# Altium footprint library ICs And Semiconductors SMD.PcbLib: 602 footprints (part 4 of 38)
Each footprint in its own frame and in the unit in brackets; x right, y up, seen from the top. Pads: shape width x height; smd on the part's side, far side on the other; paste and mask are expansions set on the pad; w line width, h text height; cw(c..) or ccw(c..) is an arc to the next point about the centre after c.
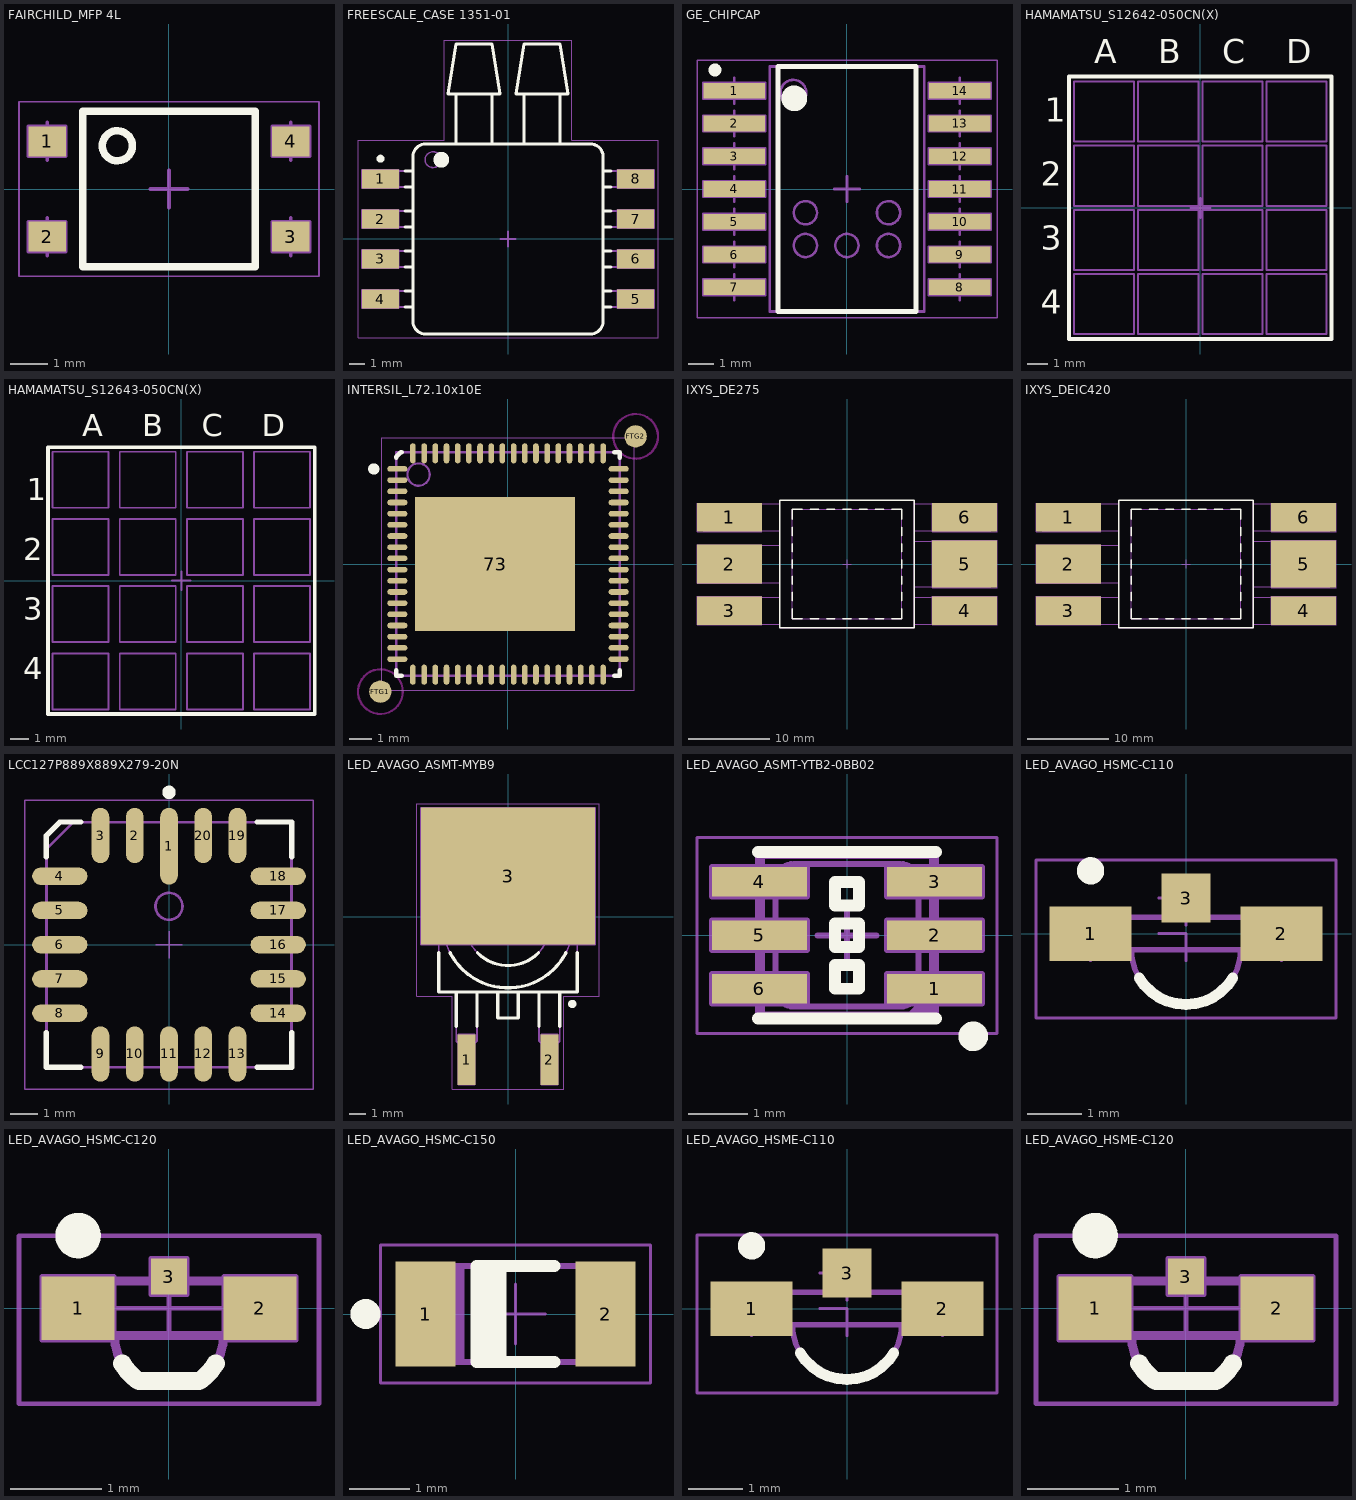
[diagram p3: the footprints below, top view; thin cyan lines are the x and y axes]

## FAIRCHILD_MFP 4L [mm] "4-Leads Surface Mount SOIC Package, Body 5.3x4.4mm, Pitch 2.54mm"
height 2.4
pads (4):
  rect 1x0.8 smd: 1(-3.25,1.27) 2(-3.25,-1.27) 3(3.25,-1.27) 4(3.25,1.27)
Top Overlay:
  circle w0.2: c-1.377,1.152 r0.4
  lines w0.2: -2.3,-2.075 2.3,-2.075 2.3,2.075 -2.3,2.075 -2.3,-2.075
Mechanical 8:
  lines w0.1: -3.75,-1.27 -3.25,-1.27 ; -3.75,1.27 -3.25,1.27 ; -3.25,-1.77 -3.25,-1.27 ; -3.25,-0.77 -3.25,-1.27 ; -3.25,0.77 -3.25,1.27 ; -3.25,1.77 -3.25,1.27 ; -2.75,-1.27 -3.25,-1.27 ; -2.75,1.27 -3.25,1.27 ; -0.5,0 0,0 ; 0,-0.5 0,0 ; 0,0.5 0,0 ; 0.5,0 0,0 ; 2.75,-1.27 3.25,-1.27 ; 2.75,1.27 3.25,1.27 ; 3.25,-1.77 3.25,-1.27 ; 3.25,-0.77 3.25,-1.27 ; 3.25,0.77 3.25,1.27 ; 3.25,1.77 3.25,1.27 ; 3.75,-1.27 3.25,-1.27 ; 3.75,1.27 3.25,1.27 ; -3.75,-1.67 -3.75,-0.87 -2.75,-0.87 ; -3.75,-1.67 -2.75,-1.67 -2.75,-0.87 ; -3.75,-1.67 -2.75,-0.87 ; -3.75,0.87 -3.75,1.67 -2.75,1.67 ; -3.75,0.87 -2.75,0.87 -2.75,1.67 ; -3.75,0.87 -2.75,1.67 ; 2.75,-1.67 2.75,-0.87 3.75,-0.87 3.75,-1.67 2.75,-1.67 ; 2.75,0.87 2.75,1.67 3.75,1.67 3.75,0.87 2.75,0.87
Mechanical 14:
  circle w0.1: c-1.377,1.152 r0.4
  lines w0.1: -2.3,-2.075 2.3,-2.075 2.3,2.075 -2.3,2.075 -2.3,-2.075
Mechanical 15:
  lines w0.05: -4,-2.325 -4,2.325 4,2.325 4,-2.325 -4,-2.325
3D body "FAIRCHILD_MFP 4L.stp": height 2.4, standoff 0, extent -3.514,-2.075 3.514,2.075

## FREESCALE_CASE 1351-01 [mm] "SOIC, 2.54mm Pitch; 8 Pin, 12.065mm W X 12.065mm L X 9.906mm H Body FREESCALE Case 1351-01"
height 9.906
pads (8):
  rect 2.35x1.2 smd: 1(-8.1,3.81) 2(-8.1,1.27) 3(-8.1,-1.27) 4(-8.1,-3.81) 5(8.1,-3.81) 6(8.1,-1.27) 7(8.1,1.27) 8(8.1,3.81)
Top Overlay:
  circle w0.5: c-4.235,5.035 r0.25
  circle w0.25: c-8.1,5.1 r0.125
  lines w0.2: -6.525,-4.318 -6.035,-4.318 ; -6.525,-3.302 -6.035,-3.302 ; -6.525,-1.778 -6.035,-1.778 ; -6.525,-0.762 -6.035,-0.762 ; -6.525,0.762 -6.035,0.762 ; -6.525,1.778 -6.035,1.778 ; -6.525,3.302 -6.035,3.302 ; -6.525,4.318 -6.035,4.318 ; -3.309,6.035 -3.309,9.21 ; -1.009,6.035 -1.009,9.21 ; 1.009,6.035 1.009,9.21 ; 3.309,6.035 3.309,9.21 ; 6.035,-4.318 6.525,-4.318 ; 6.035,-3.302 6.525,-3.302 ; 6.035,-1.778 6.525,-1.778 ; 6.035,-0.762 6.525,-0.762 ; 6.035,0.762 6.525,0.762 ; 6.035,1.778 6.525,1.778 ; 6.035,3.302 6.525,3.302 ; 6.035,4.318 6.525,4.318 ; -6.035,-5.235 ccw(c-5.235,-5.235) -5.235,-6.035 5.235,-6.035 ccw(c5.235,-5.235) 6.035,-5.235 6.035,5.235 ccw(c5.235,5.235) 5.235,6.035 -5.235,6.035 ccw(c-5.235,5.235) -6.035,5.235 -6.035,-5.235 ; -3.81,9.21 -3.309,12.385 -1.009,12.385 -0.508,9.21 -3.81,9.21 ; 0.508,9.21 1.009,12.385 3.309,12.385 3.81,9.21 0.508,9.21
Mechanical 8:
  lines w0.1: -8.6,-3.81 -8.1,-3.81 ; -8.6,-1.27 -8.1,-1.27 ; -8.6,1.27 -8.1,1.27 ; -8.6,3.81 -8.1,3.81 ; -8.1,-4.31 -8.1,-3.81 ; -8.1,-3.31 -8.1,-3.81 ; -8.1,-1.77 -8.1,-1.27 ; -8.1,-0.77 -8.1,-1.27 ; -8.1,0.77 -8.1,1.27 ; -8.1,1.77 -8.1,1.27 ; -8.1,3.31 -8.1,3.81 ; -8.1,4.31 -8.1,3.81 ; -7.6,-3.81 -8.1,-3.81 ; -7.6,-1.27 -8.1,-1.27 ; -7.6,1.27 -8.1,1.27 ; -7.6,3.81 -8.1,3.81 ; -0.5,0 0,0 ; 0,-0.5 0,0 ; 0,0.5 0,0 ; 0.5,0 0,0 ; 7.6,-3.81 8.1,-3.81 ; 7.6,-1.27 8.1,-1.27 ; 7.6,1.27 8.1,1.27 ; 7.6,3.81 8.1,3.81 ; 8.1,-4.31 8.1,-3.81 ; 8.1,-3.31 8.1,-3.81 ; 8.1,-1.77 8.1,-1.27 ; 8.1,-0.77 8.1,-1.27 ; 8.1,0.77 8.1,1.27 ; 8.1,1.77 8.1,1.27 ; 8.1,3.31 8.1,3.81 ; 8.1,4.31 8.1,3.81 ; 8.6,-3.81 8.1,-3.81 ; 8.6,-1.27 8.1,-1.27 ; 8.6,1.27 8.1,1.27 ; 8.6,3.81 8.1,3.81 ; -9.275,-4.41 -6.925,-4.41 -6.925,-3.21 -9.275,-3.21 -9.275,-4.41 ; -9.275,-1.87 -6.925,-1.87 -6.925,-0.67 -9.275,-0.67 -9.275,-1.87 ; -9.275,0.67 -6.925,0.67 -6.925,1.87 -9.275,1.87 -9.275,0.67 ; -9.275,3.21 -6.925,3.21 -6.925,4.41 -9.275,4.41 -9.275,3.21 ; 6.925,-4.41 9.275,-4.41 9.275,-3.21 6.925,-3.21 6.925,-4.41 ; 6.925,-1.87 9.275,-1.87 9.275,-0.67 6.925,-0.67 6.925,-1.87 ; 6.925,0.67 9.275,0.67 9.275,1.87 6.925,1.87 6.925,0.67 ; 6.925,3.21 9.275,3.21 9.275,4.41 6.925,4.41 6.925,3.21
Mechanical 14:
  circle w0.1: c-4.76,5.035 r0.5
  lines w0.1: -6.035,-4.318 -8.793,-4.318 -8.793,-3.302 -6.035,-3.302 ; -6.035,-1.778 -8.793,-1.778 -8.793,-0.762 -6.035,-0.762 ; -6.035,0.762 -8.793,0.762 -8.793,1.778 -6.035,1.778 ; -6.035,3.302 -8.793,3.302 -8.793,4.318 -6.035,4.318 ; -3.309,6.035 -3.309,9.21 ; -1.009,6.035 -1.009,9.21 ; 1.009,6.035 1.009,9.21 ; 3.309,6.035 3.309,9.21 ; 6.035,-4.318 8.793,-4.318 8.793,-3.302 6.035,-3.302 ; 6.035,-1.778 8.793,-1.778 8.793,-0.762 6.035,-0.762 ; 6.035,0.762 8.793,0.762 8.793,1.778 6.035,1.778 ; 6.035,3.302 8.793,3.302 8.793,4.318 6.035,4.318 ; -6.035,-5.235 ccw(c-5.235,-5.235) -5.235,-6.035 5.235,-6.035 ccw(c5.235,-5.235) 6.035,-5.235 6.035,5.235 ccw(c5.235,5.235) 5.235,6.035 -5.235,6.035 ccw(c-5.235,5.235) -6.035,5.235 -6.035,-5.235 ; -3.81,9.21 -3.309,12.385 -1.009,12.385 -0.508,9.21 -3.81,9.21 ; 0.508,9.21 1.009,12.385 3.309,12.385 3.81,9.21 0.508,9.21
Mechanical 15:
  lines w0.05: -9.525,-6.285 -9.525,6.285 -4.06,6.285 -4.06,12.635 4.06,12.635 4.06,6.285 9.525,6.285 9.525,-6.285 -9.525,-6.285
3D body "FREESCALE_CASE 1351-01.stp": height 10.29, standoff -0.13, extent -8.793,-6.035 8.793,12.385

## GE_CHIPCAP [mm] "SOIC 16 ChipCap Humidity and Temperature Sensor by GE"
height 3.32
pads (14):
  rect 2.39x0.61 smd: 1(-4.37,3.81) 2(-4.37,2.54) 3(-4.37,1.27) 4(-4.37,0) 5(-4.37,-1.27) 6(-4.37,-2.54) 7(-4.37,-3.81) 8(4.37,-3.81) 9(4.37,-2.54) 10(4.37,-1.27) 11(4.37,0) 12(4.37,1.27) 13(4.37,2.54) 14(4.37,3.81)
Top Overlay:
  circle w0.5: c-2.045,3.515 r0.25
  circle w0.25: c-5.12,4.615 r0.125
  lines w0.2: -2.675,-4.75 2.675,-4.75 2.675,4.75 -2.675,4.75 -2.675,-4.75
Mechanical 8:
  circle w0.1: c0,-2.19 r0.45
  circle w0.1: c1.61,-2.19 r0.45
  circle w0.1: c-1.61,-2.19 r0.45
  circle w0.1: c1.61,-0.92 r0.45
  circle w0.1: c-1.61,-0.92 r0.45
  lines w0.1: -4.87,-3.81 -4.37,-3.81 ; -4.87,-2.54 -4.37,-2.54 ; -4.87,-1.27 -4.37,-1.27 ; -4.87,0 -4.37,0 ; -4.87,1.27 -4.37,1.27 ; -4.87,2.54 -4.37,2.54 ; -4.87,3.81 -4.37,3.81 ; -4.37,-4.31 -4.37,-3.81 ; -4.37,-3.31 -4.37,-3.81 ; -4.37,-3.04 -4.37,-2.54 ; -4.37,-2.04 -4.37,-2.54 ; -4.37,-1.77 -4.37,-1.27 ; -4.37,-0.77 -4.37,-1.27 ; -4.37,-0.5 -4.37,0 ; -4.37,0.5 -4.37,0 ; -4.37,0.77 -4.37,1.27 ; -4.37,1.77 -4.37,1.27 ; -4.37,2.04 -4.37,2.54 ; -4.37,3.04 -4.37,2.54 ; -4.37,3.31 -4.37,3.81 ; -4.37,4.31 -4.37,3.81 ; -3.87,-3.81 -4.37,-3.81 ; -3.87,-2.54 -4.37,-2.54 ; -3.87,-1.27 -4.37,-1.27 ; -3.87,0 -4.37,0 ; -3.87,1.27 -4.37,1.27 ; -3.87,2.54 -4.37,2.54 ; -3.87,3.81 -4.37,3.81 ; -0.5,0 0,0 ; 0,-0.5 0,0 ; 0,0.5 0,0 ; 0.5,0 0,0 ; 3.87,-3.81 4.37,-3.81 ; 3.87,-2.54 4.37,-2.54 ; 3.87,-1.27 4.37,-1.27 ; 3.87,0 4.37,0 ; 3.87,1.27 4.37,1.27 ; 3.87,2.54 4.37,2.54 ; 3.87,3.81 4.37,3.81 ; 4.37,-4.31 4.37,-3.81 ; 4.37,-3.31 4.37,-3.81 ; 4.37,-3.04 4.37,-2.54 ; 4.37,-2.04 4.37,-2.54 ; 4.37,-1.77 4.37,-1.27 ; 4.37,-0.77 4.37,-1.27 ; 4.37,-0.5 4.37,0 ; 4.37,0.5 4.37,0 ; 4.37,0.77 4.37,1.27 ; 4.37,1.77 4.37,1.27 ; 4.37,2.04 4.37,2.54 ; 4.37,3.04 4.37,2.54 ; 4.37,3.31 4.37,3.81 ; 4.37,4.31 4.37,3.81 ; 4.87,-3.81 4.37,-3.81 ; 4.87,-2.54 4.37,-2.54 ; 4.87,-1.27 4.37,-1.27 ; 4.87,0 4.37,0 ; 4.87,1.27 4.37,1.27 ; 4.87,2.54 4.37,2.54 ; 4.87,3.81 4.37,3.81 ; -5.565,-4.115 -3.175,-4.115 -3.175,-3.505 -5.565,-3.505 -5.565,-4.115 ; -5.565,-2.845 -3.175,-2.845 -3.175,-2.235 -5.565,-2.235 -5.565,-2.845 ; -5.565,-1.575 -3.175,-1.575 -3.175,-0.965 -5.565,-0.965 -5.565,-1.575 ; -5.565,-0.305 -3.175,-0.305 -3.175,0.305 -5.565,0.305 -5.565,-0.305 ; -5.565,0.965 -3.175,0.965 -3.175,1.575 -5.565,1.575 -5.565,0.965 ; -5.565,2.235 -3.175,2.235 -3.175,2.845 -5.565,2.845 -5.565,2.235 ; -5.565,3.505 -3.175,3.505 -3.175,4.115 -5.565,4.115 -5.565,3.505 ; 3.175,-4.115 5.565,-4.115 5.565,-3.505 3.175,-3.505 3.175,-4.115 ; 3.175,-2.845 5.565,-2.845 5.565,-2.235 3.175,-2.235 3.175,-2.845 ; 3.175,-1.575 5.565,-1.575 5.565,-0.965 3.175,-0.965 3.175,-1.575 ; 3.175,-0.305 5.565,-0.305 5.565,0.305 3.175,0.305 3.175,-0.305 ; 3.175,0.965 5.565,0.965 5.565,1.575 3.175,1.575 3.175,0.965 ; 3.175,2.235 5.565,2.235 5.565,2.845 3.175,2.845 3.175,2.235 ; 3.175,3.505 5.565,3.505 5.565,4.115 3.175,4.115 3.175,3.505
Mechanical 14:
  circle w0.1: c-2.08,3.73 r0.5
  lines w0.1: -3,-4.75 3,-4.75 3,4.75 -3,4.75 -3,-4.75
Mechanical 15:
  lines w0.05: -5.815,-5 -5.815,5 5.815,5 5.815,-5 -5.815,-5
3D body "GE_CHIPCAP.stp": height 3.32, standoff 0, extent -5.155,-4.75 5.155,4.75

## HAMAMATSU_S12642-050CN(X) [mm] "MPPC (Multi-Pixel Photon Counter), Body 13.1 x 13.1x 6.55mm"
height 6.55
Top Overlay:
  lines w0.2: -6.55,-6.55 6.55,-6.55 6.55,6.55 -6.55,6.55 -6.55,-6.55
  text "3" at -7.975,-2.1 h1.2
  text "2" at -7.975,1.1 h1.2
  text "C" at 1.1,7.225 h1.2
  text "B" at -2.1,7.225 h1.2
  text "D" at 4.3,7.225 h1.2
  text "4" at -7.975,-5.3 h1.2
  text "1" at -7.775,4.3 h1.2
  text "A" at -5.3,7.225 h1.2
Mechanical 8:
  lines w0.1: -0.5,0 0,0 ; 0,-0.5 0,0 ; 0,0.5 0,0 ; 0.5,0 0,0
Mechanical 14:
  lines w0.1: -6.55,-6.55 6.55,-6.55 6.55,6.55 -6.55,6.55 -6.55,-6.55 ; -6.3,-6.3 -3.3,-6.3 -3.3,-3.3 -6.3,-3.3 -6.3,-6.3 ; -6.3,-3.1 -3.3,-3.1 -3.3,-0.1 -6.3,-0.1 -6.3,-3.1 ; -6.3,0.1 -3.3,0.1 -3.3,3.1 -6.3,3.1 -6.3,0.1 ; -6.3,3.3 -3.3,3.3 -3.3,6.3 -6.3,6.3 -6.3,3.3 ; -3.1,-6.3 -0.1,-6.3 -0.1,-3.3 -3.1,-3.3 -3.1,-6.3 ; -3.1,-3.1 -0.1,-3.1 -0.1,-0.1 -3.1,-0.1 -3.1,-3.1 ; -3.1,0.1 -0.1,0.1 -0.1,3.1 -3.1,3.1 -3.1,0.1 ; -3.1,3.3 -0.1,3.3 -0.1,6.3 -3.1,6.3 -3.1,3.3 ; 0.1,-6.3 3.1,-6.3 3.1,-3.3 0.1,-3.3 0.1,-6.3 ; 0.1,-3.1 3.1,-3.1 3.1,-0.1 0.1,-0.1 0.1,-3.1 ; 0.1,0.1 3.1,0.1 3.1,3.1 0.1,3.1 0.1,0.1 ; 0.1,3.3 3.1,3.3 3.1,6.3 0.1,6.3 0.1,3.3 ; 3.3,-6.3 6.3,-6.3 6.3,-3.3 3.3,-3.3 3.3,-6.3 ; 3.3,-3.1 6.3,-3.1 6.3,-0.1 3.3,-0.1 3.3,-3.1 ; 3.3,0.1 6.3,0.1 6.3,3.1 3.3,3.1 3.3,0.1 ; 3.3,3.3 6.3,3.3 6.3,6.3 3.3,6.3 3.3,3.3
  text "A-4" at -5.85,-5.2 h0.8
  text "B-4" at -2.65,-5.2 h0.8
  text "C-4" at 0.55,-5.2 h0.8
  text "D-4" at 3.75,-5.2 h0.8
  text "A-3" at -5.85,-2 h0.8
  text "B-3" at -2.65,-2 h0.8
  text "C-3" at 0.55,-2 h0.8
  text "D-3" at 3.75,-2 h0.8
  text "A-2" at -5.85,1.2 h0.8
  text "B-2" at -2.65,1.2 h0.8
  text "C-2" at 0.55,1.2 h0.8
  text "D-2" at 3.75,1.2 h0.8
  text "D-1" at 3.75,4.4 h0.8
  text "C-1" at 0.55,4.4 h0.8
  text "B-1" at -2.65,4.4 h0.8
  text "A-1" at -5.85,4.4 h0.8
3D body "HAMAMATSU_S12642-050CN(X)_Part1.stp": height 5.35, standoff 0.92, extent -6.55,-6.55 6.55,6.55
3D body "HAMAMATSU_S12642-050CN(X)_Part2.stp": height 5.65, standoff 5.05, extent -6.55,-6.55 6.55,6.55

## HAMAMATSU_S12643-050CN(X) [mm] "MPPC (Multi-Pixel Photon Counter), Body 13.1 x 13.1x 6.55mm"
height 6.55
Top Overlay:
  lines w0.2: -7.15,-7.15 -7.15,7.15 7.15,7.15 7.15,-7.15 -7.15,-7.15
  text "3" at -8.475,-2.1 h1.2
  text "2" at -8.475,1.1 h1.2
  text "C" at 1.1,7.725 h1.2
  text "B" at -2.1,7.725 h1.2
  text "D" at 4.3,7.725 h1.2
  text "4" at -8.475,-5.3 h1.2
  text "1" at -8.275,4.3 h1.2
  text "A" at -5.3,7.725 h1.2
Mechanical 8:
  lines w0.1: -0.5,0 0,0 ; 0,-0.5 0,0 ; 0,0.5 0,0 ; 0.5,0 0,0
Mechanical 14:
  lines w0.1: -7.15,-7.15 -7.15,7.15 7.15,7.15 7.15,-7.15 -7.15,-7.15 ; -6.9,-6.9 -6.9,-3.9 -3.9,-3.9 -3.9,-6.9 -6.9,-6.9 ; -6.9,-3.3 -6.9,-0.3 -3.9,-0.3 -3.9,-3.3 -6.9,-3.3 ; -6.9,0.3 -6.9,3.3 -3.9,3.3 -3.9,0.3 -6.9,0.3 ; -6.9,3.9 -6.9,6.9 -3.9,6.9 -3.9,3.9 -6.9,3.9 ; -3.3,-6.9 -3.3,-3.9 -0.3,-3.9 -0.3,-6.9 -3.3,-6.9 ; -3.3,-3.3 -3.3,-0.3 -0.3,-0.3 -0.3,-3.3 -3.3,-3.3 ; -3.3,0.3 -3.3,3.3 -0.3,3.3 -0.3,0.3 -3.3,0.3 ; -3.3,3.9 -3.3,6.9 -0.3,6.9 -0.3,3.9 -3.3,3.9 ; 0.3,-6.9 0.3,-3.9 3.3,-3.9 3.3,-6.9 0.3,-6.9 ; 0.3,-3.3 0.3,-0.3 3.3,-0.3 3.3,-3.3 0.3,-3.3 ; 0.3,0.3 0.3,3.3 3.3,3.3 3.3,0.3 0.3,0.3 ; 0.3,3.9 0.3,6.9 3.3,6.9 3.3,3.9 0.3,3.9 ; 3.9,-6.9 3.9,-3.9 6.9,-3.9 6.9,-6.9 3.9,-6.9 ; 3.9,-3.3 3.9,-0.3 6.9,-0.3 6.9,-3.3 3.9,-3.3 ; 3.9,0.3 3.9,3.3 6.9,3.3 6.9,0.3 3.9,0.3 ; 3.9,3.9 3.9,6.9 6.9,6.9 6.9,3.9 3.9,3.9
  text "A-1" at -6.45,5 h0.8
  text "B-1" at -2.85,5 h0.8
  text "C-1" at 0.75,5 h0.8
  text "D-1" at 4.35,5 h0.8
  text "D-2" at 4.35,1.4 h0.8
  text "C-2" at 0.75,1.4 h0.8
  text "B-2" at -2.85,1.4 h0.8
  text "A-2" at -6.45,1.4 h0.8
  text "D-3" at 4.35,-2.2 h0.8
  text "C-3" at 0.75,-2.2 h0.8
  text "B-3" at -2.85,-2.2 h0.8
  text "A-3" at -6.45,-2.2 h0.8
  text "D-4" at 4.35,-5.8 h0.8
  text "C-4" at 0.75,-5.8 h0.8
  text "B-4" at -2.85,-5.8 h0.8
  text "A-4" at -6.45,-5.8 h0.8
3D body "HAMAMATSU_S12643-050CN(X)_Part1.stp": height 5.45, standoff 0.92, extent -7.15,-7.15 7.15,7.15
3D body "HAMAMATSU_S12643-050CN(X)_Part2.stp": height 5.75, standoff 5.15, extent -7.15,-7.15 7.15,7.15

## INTERSIL_L72.10x10E [mm] "INTERSIL Case Style L72.10x10E, QFN, 0.50mm Pitch, Square; 72 Pin, 10.00mm L X 10.00mm W X 1.00mm H body (w/ Thermal Tab 7.15 X 6mm)"
height 0.9
pads (75):
  oval 0.9x0.25 smd: 1(-4.95,4.25) 2(-4.95,3.75) 3(-4.95,3.25) 4(-4.95,2.75) 5(-4.95,2.25) 6(-4.95,1.75) 7(-4.95,1.25) 8(-4.95,0.75) 9(-4.95,0.25) 10(-4.95,-0.25) 11(-4.95,-0.75) 12(-4.95,-1.25) 13(-4.95,-1.75) 14(-4.95,-2.25) 15(-4.95,-2.75) 16(-4.95,-3.25) 17(-4.95,-3.75) 18(-4.95,-4.25) 37(4.95,-4.25) 38(4.95,-3.75) 39(4.95,-3.25) 40(4.95,-2.75) 41(4.95,-2.25) 42(4.95,-1.75) 43(4.95,-1.25) 44(4.95,-0.75) 45(4.95,-0.25) 46(4.95,0.25) 47(4.95,0.75) 48(4.95,1.25) 49(4.95,1.75) 50(4.95,2.25) 51(4.95,2.75) 52(4.95,3.25) 53(4.95,3.75) 54(4.95,4.25)
  oval 0.25x0.9 smd: 19(-4.25,-4.95) 20(-3.75,-4.95) 21(-3.25,-4.95) 22(-2.75,-4.95) 23(-2.25,-4.95) 24(-1.75,-4.95) 25(-1.25,-4.95) 26(-0.75,-4.95) 27(-0.25,-4.95) 28(0.25,-4.95) 29(0.75,-4.95) 30(1.25,-4.95) 31(1.75,-4.95) 32(2.25,-4.95) 33(2.75,-4.95) 34(3.25,-4.95) 35(3.75,-4.95) 36(4.25,-4.95) 55(4.25,4.95) 56(3.75,4.95) 57(3.25,4.95) 58(2.75,4.95) 59(2.25,4.95) 60(1.75,4.95) 61(1.25,4.95) 62(0.75,4.95) 63(0.25,4.95) 64(-0.25,4.95) 65(-0.75,4.95) 66(-1.25,4.95) 67(-1.75,4.95) 68(-2.25,4.95) 69(-2.75,4.95) 70(-3.25,4.95) 71(-3.75,4.95) 72(-4.25,4.95)
  rect 7.15x6 smd: 73(-0.575,0)
  round 1 smd paste-0.51 mask+0.5: FTG1(-5.707,-5.707) FTG2(5.707,5.707)
Top Layer keep-out:
  circle w0.1: c5.707,5.707 r1
  circle w0.1: c-5.707,-5.707 r1
Top Overlay:
  circle w0.25: c-6,4.25 r0.125
  lines w0.2: -5,-4.75 -5,-5 -4.75,-5 ; -5,4.75 -5,4.8 -4.8,5 -4.75,5 ; 4.75,-5 5,-5 5,-4.75 ; 4.75,5 5,5 5,4.75
Top Paste:
  region: 0.815,0.4 2.395,0.4 2.395,2.2 0.815,2.2
  region: -1.365,0.4 0.215,0.4 0.215,2.2 -1.365,2.2
  region: -3.545,0.4 -1.965,0.4 -1.965,2.2 -3.545,2.2
  region: 0.815,-2.2 2.395,-2.2 2.395,-0.4 0.815,-0.4
  region: -1.365,-2.2 0.215,-2.2 0.215,-0.4 -1.365,-0.4
  region: -3.545,-2.2 -1.965,-2.2 -1.965,-0.4 -3.545,-0.4
Mechanical 14:
  circle w0.1: c-4,4 r0.5
  lines w0.1: -5,-5 -5,5 5,5 5,-5 -5,-5
Mechanical 15:
  circle w0.05: c0,0 r0.35
  lines w0.05: -0.5,0 0.5,0 ; 0,-0.5 0,0.5 ; -5.65,-5.65 -5.65,5.65 5.65,5.65 5.65,-5.65 -5.65,-5.65
3D body "INTERSIL_L72.10x10E.stp": height 0.9, standoff 0, extent -5,-5 5,5

## IXYS_DE275 [mm] "IXYS DIRECT ENERGY INC. Case DE275"
height 2.67
pads (6):
  rect 7.95x3.5 smd: 1(-14.425,5.715) 3(-14.425,-5.715) 4(14.425,-5.715) 6(14.425,5.715)
  rect 7.95x4.77 smd: 2(-14.425,0)
  rect 7.95x5.79 smd: 5(14.425,0)
Top Overlay:
  lines w0.2: -6.73,-5.5 -6.73,-6.73 -5.5,-6.73 ; -6.73,-4.5 -6.73,-3.5 ; -6.73,-2.5 -6.73,-1.5 ; -6.73,-0.5 -6.73,0.5 ; -6.73,1.5 -6.73,2.5 ; -6.73,3.5 -6.73,4.5 ; -6.73,5.5 -6.73,6.73 -5.5,6.73 ; -4.5,-6.73 -3.5,-6.73 ; -4.5,6.73 -3.5,6.73 ; -2.5,-6.73 -1.5,-6.73 ; -2.5,6.73 -1.5,6.73 ; -0.5,-6.73 0.5,-6.73 ; -0.5,6.73 0.5,6.73 ; 1.5,-6.73 2.5,-6.73 ; 1.5,6.73 2.5,6.73 ; 3.5,-6.73 4.5,-6.73 ; 3.5,6.73 4.5,6.73 ; 5.5,-6.73 6.73,-6.73 6.73,-5.5 ; 5.5,6.73 6.73,6.73 6.73,5.5 ; 6.73,-4.5 6.73,-3.5 ; 6.73,-2.5 6.73,-1.5 ; 6.73,-0.5 6.73,0.5 ; 6.73,1.5 6.73,2.5 ; 6.73,3.5 6.73,4.5 ; -8.255,-7.8 8.255,-7.8 8.255,7.8 -8.255,7.8 -8.255,-7.8
Mechanical 8:
  lines w0.1: -14.925,-5.715 -14.425,-5.715 ; -14.925,0 -14.425,0 ; -14.925,5.715 -14.425,5.715 ; -14.425,-6.215 -14.425,-5.715 ; -14.425,-5.215 -14.425,-5.715 ; -14.425,-0.5 -14.425,0 ; -14.425,0.5 -14.425,0 ; -14.425,5.215 -14.425,5.715 ; -14.425,6.215 -14.425,5.715 ; -13.925,-5.715 -14.425,-5.715 ; -13.925,0 -14.425,0 ; -13.925,5.715 -14.425,5.715 ; -0.5,0 0,0 ; 0,-0.5 0,0 ; 0,0.5 0,0 ; 0.5,0 0,0 ; 13.925,-5.715 14.425,-5.715 ; 13.925,0 14.425,0 ; 13.925,5.715 14.425,5.715 ; 14.425,-6.215 14.425,-5.715 ; 14.425,-5.215 14.425,-5.715 ; 14.425,-0.5 14.425,0 ; 14.425,0.5 14.425,0 ; 14.425,5.215 14.425,5.715 ; 14.425,6.215 14.425,5.715 ; 14.925,-5.715 14.425,-5.715 ; 14.925,0 14.425,0 ; 14.925,5.715 14.425,5.715 ; -18.4,-7.465 -18.4,-3.965 -10.45,-3.965 -10.45,-7.465 -18.4,-7.465 ; -18.4,-2.385 -18.4,2.385 -10.45,2.385 -10.45,-2.385 -18.4,-2.385 ; -18.4,3.965 -18.4,7.465 -10.45,7.465 -10.45,3.965 -18.4,3.965 ; -6.73,-6.73 -6.73,6.73 6.73,6.73 6.73,-6.73 -6.73,-6.73 ; 10.45,-7.465 10.45,-3.965 18.4,-3.965 18.4,-7.465 10.45,-7.465 ; 10.45,-2.895 10.45,2.895 18.4,2.895 18.4,-2.895 10.45,-2.895 ; 10.45,3.965 10.45,7.465 18.4,7.465 18.4,3.965 10.45,3.965
Mechanical 14:
  lines w0.1: -8.255,-7.365 -17.615,-7.365 -17.615,-4.065 -8.255,-4.065 ; -8.255,-2.285 -17.615,-2.285 -17.615,2.285 -8.255,2.285 ; -8.255,4.065 -17.615,4.065 -17.615,7.365 -8.255,7.365 ; -6.73,-5.5 -6.73,-6.73 -5.5,-6.73 ; -6.73,-4.5 -6.73,-3.5 ; -6.73,-2.5 -6.73,-1.5 ; -6.73,-0.5 -6.73,0.5 ; -6.73,1.5 -6.73,2.5 ; -6.73,3.5 -6.73,4.5 ; -6.73,5.5 -6.73,6.73 -5.5,6.73 ; -4.5,-6.73 -3.5,-6.73 ; -4.5,6.73 -3.5,6.73 ; -2.5,-6.73 -1.5,-6.73 ; -2.5,6.73 -1.5,6.73 ; -0.5,-6.73 0.5,-6.73 ; -0.5,6.73 0.5,6.73 ; 1.5,-6.73 2.5,-6.73 ; 1.5,6.73 2.5,6.73 ; 3.5,-6.73 4.5,-6.73 ; 3.5,6.73 4.5,6.73 ; 5.5,-6.73 6.73,-6.73 6.73,-5.5 ; 5.5,6.73 6.73,6.73 6.73,5.5 ; 6.73,-4.5 6.73,-3.5 ; 6.73,-2.5 6.73,-1.5 ; 6.73,-0.5 6.73,0.5 ; 6.73,1.5 6.73,2.5 ; 6.73,3.5 6.73,4.5 ; 8.255,-7.365 17.615,-7.365 17.615,-4.065 8.255,-4.065 ; 8.255,-2.795 17.615,-2.795 17.615,2.795 8.255,2.795 ; 8.255,4.065 17.615,4.065 17.615,7.365 8.255,7.365 ; -8.255,-7.8 8.255,-7.8 8.255,7.8 -8.255,7.8 -8.255,-7.8
3D body "DEIC420.stp": height 3.3, standoff 0, extent -17.615,-7.8 17.615,7.8

## IXYS_DEIC420 [mm] "IXYS DIRECT ENERGY INC. Case DEI420"
height 2.67
pads (6):
  rect 7.95x3.5 smd: 1(-14.425,5.715) 3(-14.425,-5.715) 4(14.425,-5.715) 6(14.425,5.715)
  rect 7.95x4.77 smd: 2(-14.425,0)
  rect 7.95x5.79 smd: 5(14.425,0)
Top Overlay:
  lines w0.2: -6.73,-5.5 -6.73,-6.73 -5.5,-6.73 ; -6.73,-4.5 -6.73,-3.5 ; -6.73,-2.5 -6.73,-1.5 ; -6.73,-0.5 -6.73,0.5 ; -6.73,1.5 -6.73,2.5 ; -6.73,3.5 -6.73,4.5 ; -6.73,5.5 -6.73,6.73 -5.5,6.73 ; -4.5,-6.73 -3.5,-6.73 ; -4.5,6.73 -3.5,6.73 ; -2.5,-6.73 -1.5,-6.73 ; -2.5,6.73 -1.5,6.73 ; -0.5,-6.73 0.5,-6.73 ; -0.5,6.73 0.5,6.73 ; 1.5,-6.73 2.5,-6.73 ; 1.5,6.73 2.5,6.73 ; 3.5,-6.73 4.5,-6.73 ; 3.5,6.73 4.5,6.73 ; 5.5,-6.73 6.73,-6.73 6.73,-5.5 ; 5.5,6.73 6.73,6.73 6.73,5.5 ; 6.73,-4.5 6.73,-3.5 ; 6.73,-2.5 6.73,-1.5 ; 6.73,-0.5 6.73,0.5 ; 6.73,1.5 6.73,2.5 ; 6.73,3.5 6.73,4.5 ; -8.255,-7.8 8.255,-7.8 8.255,7.8 -8.255,7.8 -8.255,-7.8
Mechanical 8:
  lines w0.1: -14.925,-5.715 -14.425,-5.715 ; -14.925,0 -14.425,0 ; -14.925,5.715 -14.425,5.715 ; -14.425,-6.215 -14.425,-5.715 ; -14.425,-5.215 -14.425,-5.715 ; -14.425,-0.5 -14.425,0 ; -14.425,0.5 -14.425,0 ; -14.425,5.215 -14.425,5.715 ; -14.425,6.215 -14.425,5.715 ; -13.925,-5.715 -14.425,-5.715 ; -13.925,0 -14.425,0 ; -13.925,5.715 -14.425,5.715 ; -0.5,0 0,0 ; 0,-0.5 0,0 ; 0,0.5 0,0 ; 0.5,0 0,0 ; 13.925,-5.715 14.425,-5.715 ; 13.925,0 14.425,0 ; 13.925,5.715 14.425,5.715 ; 14.425,-6.215 14.425,-5.715 ; 14.425,-5.215 14.425,-5.715 ; 14.425,-0.5 14.425,0 ; 14.425,0.5 14.425,0 ; 14.425,5.215 14.425,5.715 ; 14.425,6.215 14.425,5.715 ; 14.925,-5.715 14.425,-5.715 ; 14.925,0 14.425,0 ; 14.925,5.715 14.425,5.715 ; -18.4,-7.465 -18.4,-3.965 -10.45,-3.965 -10.45,-7.465 -18.4,-7.465 ; -18.4,-2.385 -18.4,2.385 -10.45,2.385 -10.45,-2.385 -18.4,-2.385 ; -18.4,3.965 -18.4,7.465 -10.45,7.465 -10.45,3.965 -18.4,3.965 ; -6.73,-6.73 -6.73,6.73 6.73,6.73 6.73,-6.73 -6.73,-6.73 ; 10.45,-7.465 10.45,-3.965 18.4,-3.965 18.4,-7.465 10.45,-7.465 ; 10.45,-2.895 10.45,2.895 18.4,2.895 18.4,-2.895 10.45,-2.895 ; 10.45,3.965 10.45,7.465 18.4,7.465 18.4,3.965 10.45,3.965
Mechanical 14:
  lines w0.1: -8.255,-7.365 -17.615,-7.365 -17.615,-4.065 -8.255,-4.065 ; -8.255,-2.285 -17.615,-2.285 -17.615,2.285 -8.255,2.285 ; -8.255,4.065 -17.615,4.065 -17.615,7.365 -8.255,7.365 ; -6.73,-5.5 -6.73,-6.73 -5.5,-6.73 ; -6.73,-4.5 -6.73,-3.5 ; -6.73,-2.5 -6.73,-1.5 ; -6.73,-0.5 -6.73,0.5 ; -6.73,1.5 -6.73,2.5 ; -6.73,3.5 -6.73,4.5 ; -6.73,5.5 -6.73,6.73 -5.5,6.73 ; -4.5,-6.73 -3.5,-6.73 ; -4.5,6.73 -3.5,6.73 ; -2.5,-6.73 -1.5,-6.73 ; -2.5,6.73 -1.5,6.73 ; -0.5,-6.73 0.5,-6.73 ; -0.5,6.73 0.5,6.73 ; 1.5,-6.73 2.5,-6.73 ; 1.5,6.73 2.5,6.73 ; 3.5,-6.73 4.5,-6.73 ; 3.5,6.73 4.5,6.73 ; 5.5,-6.73 6.73,-6.73 6.73,-5.5 ; 5.5,6.73 6.73,6.73 6.73,5.5 ; 6.73,-4.5 6.73,-3.5 ; 6.73,-2.5 6.73,-1.5 ; 6.73,-0.5 6.73,0.5 ; 6.73,1.5 6.73,2.5 ; 6.73,3.5 6.73,4.5 ; 8.255,-7.365 17.615,-7.365 17.615,-4.065 8.255,-4.065 ; 8.255,-2.795 17.615,-2.795 17.615,2.795 8.255,2.795 ; 8.255,4.065 17.615,4.065 17.615,7.365 8.255,7.365 ; -8.255,-7.8 8.255,-7.8 8.255,7.8 -8.255,7.8 -8.255,-7.8
3D body "DEIC420.stp": height 3.3, standoff 0, extent -17.615,-7.8 17.615,7.8

## LCC127P889X889X279-20N [mm] "LCC,1.27mm pitch, square, 5 pin X 5 pin, 8.89mm X 8.89mm X 2.79mm H 2.79mm"
height 2.79
pads (20):
  oval 0.65x2.85 smd: 1(0,3.65)
  oval 0.65x2.05 smd: 2(-1.27,4.05) 3(-2.54,4.05) 9(-2.54,-4.05) 10(-1.27,-4.05) 11(0,-4.05) 12(1.27,-4.05) 13(2.54,-4.05) 19(2.54,4.05) 20(1.27,4.05)
  oval 2.05x0.65 smd: 4(-4.05,2.54) 5(-4.05,1.27) 6(-4.05,0) 7(-4.05,-1.27) 8(-4.05,-2.54) 14(4.05,-2.54) 15(4.05,-1.27) 16(4.05,0) 17(4.05,1.27) 18(4.05,2.54)
Top Overlay:
  circle w0.25: c0,5.65 r0.125
  lines w0.2: -4.55,-3.265 -4.55,-4.55 -3.265,-4.55 ; -4.55,3.265 -4.55,4.05 -4.05,4.55 -3.265,4.55 ; 3.265,-4.55 4.55,-4.55 4.55,-3.265 ; 3.265,4.55 4.55,4.55 4.55,3.265
Mechanical 14:
  circle w0.1: c0,1.425 r0.5
  lines w0.1: -4.545,-4.545 -4.545,3.545 -3.545,4.545 4.545,4.545 4.545,-4.545 -4.545,-4.545
Mechanical 15:
  lines w0.05: -0.5,0 0.5,0 ; 0,-0.5 0,0.5 ; -5.35,-5.35 -5.35,5.35 5.35,5.35 5.35,-5.35 -5.35,-5.35
3D body: height 1.8, standoff 0, extent -0.35,2.3 0.35,4.55
3D body: height 1.8, standoff 0, extent -1.62,-4.55 -0.92,-3.15
3D body: height 1.8, standoff 0, extent -2.89,-4.55 -2.19,-3.15
3D body: height 1.8, standoff 0, extent -4.55,-2.89 -3.15,-2.19
3D body: height 1.8, standoff 0, extent -4.55,-1.62 -3.15,-0.92
3D body: height 1.8, standoff 0, extent -4.55,-0.35 -3.15,0.35
3D body: height 1.8, standoff 0, extent -4.55,0.92 -3.15,1.62
3D body: height 1.8, standoff 0, extent -4.55,2.19 -3.15,2.89
3D body: height 1.8, standoff 0, extent -2.89,3.15 -2.19,4.55
3D body: height 1.8, standoff 0, extent -1.62,3.15 -0.92,4.55
3D body: height 1.8, standoff 0, extent -0.35,-4.55 0.35,-3.15
3D body: height 1.8, standoff 0, extent 0.92,-4.55 1.62,-3.15
3D body: height 1.8, standoff 0, extent 2.19,-4.55 2.89,-3.15
3D body: height 1.8, standoff 0, extent 3.15,-2.89 4.55,-2.19
3D body: height 1.8, standoff 0, extent 3.15,-1.62 4.55,-0.92
3D body: height 1.8, standoff 0, extent 3.15,-0.35 4.55,0.35
3D body: height 1.8, standoff 0, extent 3.15,0.92 4.55,1.62
3D body: height 1.8, standoff 0, extent 3.15,2.19 4.55,2.89
3D body: height 1.8, standoff 0, extent 2.2,3.15 2.9,4.55
3D body: height 1.8, standoff 0, extent 0.92,3.15 1.62,4.55
3D body "LCC127P889X889X279-20N.stp": height 2.79, standoff 0, extent -4.545,-4.545 4.545,4.545

## LED_AVAGO_ASMT-MYB9 [mm] "Warm White LED, Body 10x10.6mm, Pin spacing 5.08mm (Exposed Pad 10.7mm x 8.4mm)"
height 3.3
pads (3):
  rect 1.1x3.1 smd: 1(-2.54,-8.75) 2(2.54,-8.75)
  rect 10.7x8.4 smd: 3(0,2.5)
Top Overlay:
  circle w0.25: c3.939,-5.334 r0.125
  lines w0.2: -4.25,-2.2 -4.25,-4.6 4.25,-4.6 4.25,-2.2 ; -3.546,-2.2 ccw(c0,-0.35) 3.546,-2.2 ; -3.175,-6.7 -3.175,-4.6 ; -1.905,-6.7 -1.905,-4.6 ; -1.869,-2.2 ccw(c0,-0.35) 1.869,-2.2 ; -0.635,-4.6 -0.635,-6.2 0.635,-6.2 0.635,-4.6 ; 1.905,-6.7 1.905,-4.6 ; 3.175,-6.7 3.175,-4.6
Mechanical 8:
  lines w0.1: -3.04,-8.75 -2.54,-8.75 ; -2.54,-9.25 -2.54,-8.75 ; -2.54,-8.25 -2.54,-8.75 ; -2.04,-8.75 -2.54,-8.75 ; -0.5,0 0,0 ; -0.5,2.5 0,2.5 ; 0,-0.5 0,0 ; 0,0.5 0,0 ; 0,2 0,2.5 ; 0,3 0,2.5 ; 0.5,0 0,0 ; 0.5,2.5 0,2.5 ; 2.04,-8.75 2.54,-8.75 ; 2.54,-9.25 2.54,-8.75 ; 2.54,-8.25 2.54,-8.75 ; 3.04,-8.75 2.54,-8.75 ; -5.35,-1.7 -5.35,6.7 5.35,6.7 5.35,-1.7 -5.35,-1.7 ; -3.04,-10.3 -3.04,-7.2 -2.04,-7.2 -2.04,-10.3 -3.04,-10.3 ; 2.04,-10.3 2.04,-7.2 3.04,-7.2 3.04,-10.3 2.04,-10.3
Mechanical 14:
  circle w0.1: c0,-0.35 r4
  circle w0.1: c0,-0.35 r2.63
  lines w0.1: -3.5,3.9 -3.5,4.73 -5,4.73 -5,5.5 -4.5,6 4.5,6 5,5.5 5,4.73 3.5,4.73 3.5,3.9 ; -3.175,-4.6 -3.175,-7.62 -2.945,-7.85 -2.945,-9.85 -2.135,-9.85 -2.135,-7.85 -1.905,-7.62 -1.905,-4.6 ; -0.635,-4.6 -0.635,-6.2 0.635,-6.2 0.635,-4.6 ; 1.905,-4.6 1.905,-7.62 2.135,-7.85 2.135,-9.85 2.945,-9.85 2.945,-7.85 3.175,-7.62 3.175,-4.6 ; -4.25,-4.6 4.25,-4.6 4.25,3.9 -4.25,3.9 -4.25,-4.6
Mechanical 15:
  lines w0.05: -5.6,-4.85 -3.425,-4.85 -3.425,-10.55 3.425,-10.55 3.425,-4.85 5.6,-4.85 5.6,6.95 -5.6,6.95 -5.6,-4.85
3D body "LED_AVAGO_ASMT-MYB9-NKM00.stp": height 3.3, standoff 0, extent -5,-9.85 5,6

## LED_AVAGO_ASMT-YTB2-0BB02 [mm] "High Brightness Tricolor (RGB) Surface Mount LED, Body 3x2.8mm"
height 1.8
pads (6):
  rect 1.6x0.5 smd: 1(1.475,-0.9) 2(1.475,0) 3(1.475,0.9) 4(-1.475,0.9) 5(-1.475,0) 6(-1.475,-0.9)
Top Overlay:
  circle w0.25: c2.125,-1.7 r0.125
  lines w0.2: -1.5,-1.4 1.5,-1.4 ; -1.5,1.4 1.5,1.4 ; -0.2,-0.9 -0.2,-0.5 0.2,-0.5 0.2,-0.9 -0.2,-0.9 ; -0.2,-0.2 -0.2,0.2 0.2,0.2 0.2,-0.2 -0.2,-0.2 ; -0.2,0.5 0.2,0.5 0.2,0.9 -0.2,0.9 -0.2,0.5
Mechanical 8:
  lines w0.1: -1.975,-0.9 -1.475,-0.9 ; -1.975,0 -1.475,0 ; -1.975,0.9 -1.475,0.9 ; -1.475,-1.4 -1.475,-0.9 ; -1.475,1.4 -1.475,0.9 ; -0.975,-0.9 -1.475,-0.9 ; -0.975,0 -1.475,0 ; -0.975,0.9 -1.475,0.9 ; -0.5,0 0,0 ; 0,-0.5 0,0 ; 0,0.5 0,0 ; 0.5,0 0,0 ; 0.975,-0.9 1.475,-0.9 ; 0.975,0 1.475,0 ; 0.975,0.9 1.475,0.9 ; 1.475,-1.4 1.475,-0.9 ; 1.475,1.4 1.475,0.9 ; 1.975,-0.9 1.475,-0.9 ; 1.975,0 1.475,0 ; 1.975,0.9 1.475,0.9 ; -1.475,-0.9 -1.475,0 ; -1.475,0 -1.475,0.9 ; 1.475,-0.9 1.475,0 ; 1.475,0 1.475,0.9 ; -2.275,-1.15 -2.275,-0.65 -0.675,-0.65 -0.675,-1.15 -2.275,-1.15 ; -2.275,-0.25 -2.275,0.25 -0.675,0.25 -0.675,-0.25 -2.275,-0.25 ; -2.275,0.65 -2.275,1.15 -0.675,1.15 -0.675,0.65 -2.275,0.65 ; 0.675,-1.15 0.675,-0.65 2.275,-0.65 2.275,-1.15 0.675,-1.15 ; 0.675,-0.25 0.675,0.25 2.275,0.25 2.275,-0.25 0.675,-0.25 ; 0.675,0.65 0.675,1.15 2.275,1.15 2.275,0.65 0.675,0.65
Mechanical 14:
  lines w0.1: 1.07,-1.33 1.43,-0.97 ; 1.195,-1.33 1.43,-1.095 ; 1.27,-1.355 1.43,-1.195 ; -1.5,-1.4 -1.43,-1.33 ; -1.5,-1.4 1.5,-1.4 ; -1.5,-1.4 -1.5,1.4 ; -1.5,1.4 -1.43,1.33 ; -1.5,1.4 1.5,1.4 ; -1.43,-1.33 -1.43,1.33 ; -1.43,-1.33 1.43,-1.33 ; -1.43,1.33 1.43,1.33 ; 1.43,-1.33 1.5,-1.4 ; 1.43,-1.33 1.43,1.33 ; 1.43,1.33 1.5,1.4 ; 1.5,-1.4 1.5,1.4 ; -1.2,-0.9 ccw(c-0.9,-0.9) -0.9,-1.2 0.9,-1.2 ccw(c0.9,-0.9) 1.2,-0.9 1.2,0.9 ccw(c0.9,0.9) 0.9,1.2 -0.9,1.2 ccw(c-0.9,0.9) -1.2,0.9 -1.2,-0.9 ; -0.2,-0.9 -0.2,-0.5 0.2,-0.5 0.2,-0.9 -0.2,-0.9 ; -0.2,-0.2 -0.2,0.2 0.2,0.2 0.2,-0.2 -0.2,-0.2 ; -0.2,0.5 0.2,0.5 0.2,0.9 -0.2,0.9 -0.2,0.5
Mechanical 15:
  lines w0.05: -2.525,-1.65 2.525,-1.65 2.525,1.65 -2.525,1.65 -2.525,-1.65
3D body "LED_AVAGO_ASMT-YTB2-0BB02.stp": height 1.8, standoff 0, extent -1.7,-1.4 1.7,1.4

## LED_AVAGO_HSMC-C110 [mm] "Red Chip LED, 2-Leads, Body 3.3x1.6mm, Side Emitting Package"
height 1.1
pads (3):
  rect 1.5x1 smd: 1(-1.75,0) 2(1.75,0)
  rect 0.9x0.9 smd: 3(0,0.65)
Top Overlay:
  circle w0.25: c-1.75,1.15 r0.125
  lines w0.2: -0.857,-0.814 ccw(c0,-0.3) 0.857,-0.814
Mechanical 8:
  lines w0.05: -2.25,0 -1.75,0 -1.75,-0.5 ; -0.5,0 0,0 0,-0.5 ; -0.5,0.65 0,0.65 0,0.15 ; 1.25,0 1.75,0 1.75,-0.5
  text "K" at -1.483,-0.25 h0.5
Mechanical 14:
  lines w0.1: -1,-0.3 ccw(c0,-0.3) 1,-0.3 ; -1.65,-0.3 -1.65,0.3 1.65,0.3 1.65,-0.3 -1.65,-0.3
Mechanical 15:
  lines w0.05: -2.75,-1.55 -2.75,1.35 2.75,1.35 2.75,-1.55 -2.75,-1.55
3D body "LED_AVAGO_HSMC-C110.stp": height 1, standoff 0, extent -1.65,-1.3 1.65,0.3

## LED_AVAGO_HSMC-C120 [mm] "Red Chip LED, 2-Leads, Body 1.7x1.1mm, Side Emitting Package"
height 0.7
pads (3):
  rect 0.8x0.7 smd: 1(-1,0) 2(1,0)
  rect 0.4x0.4 smd: 3(0,0.35)
Top Overlay:
  circle w0.25: c-1,0.8 r0.125
  lines w0.2: -0.514,-0.609 ccw(c0,-0.3) -0.332,-0.8 0.332,-0.8 ccw(c0,-0.3) 0.514,-0.609
Mechanical 8:
  lines w0.05: -1,0 1,0 ; 0,0 0,0.35 ; -1.4,-0.35 -0.6,-0.35 -0.6,0.35 -1.4,0.35 -1.4,-0.35 ; -0.2,0.15 0.2,0.15 0.2,0.55 -0.2,0.55 -0.2,0.15 ; 0.6,-0.35 1.4,-0.35 1.4,0.35 0.6,0.35 0.6,-0.35
Mechanical 14:
  lines w0.1: -0.6,-0.3 ccw(c0,-0.3) -0.332,-0.8 0.332,-0.8 ccw(c0,-0.3) 0.6,-0.3 ; -0.85,-0.3 -0.85,0.3 0.85,0.3 0.85,-0.3 -0.85,-0.3
Mechanical 15:
  lines w0.05: -0.3,0 0.3,0 ; 0,-0.3 0,0.3 ; -1.65,-1.05 1.65,-1.05 1.65,0.8 -1.65,0.8 -1.65,-1.05
3D body "LED_AVAGO_HSMC-C120.stp": height 0.7, standoff 0, extent -0.85,-0.8 0.85,0.3

## LED_AVAGO_HSMC-C150 [mm] "Red Chip LED, 2-Leads, Body 3.2 x1.6mm, IPC Medium Density"
height 1.2
pads (2):
  rect 1x1.75 smd: 1(-1.5,0) 2(1.5,0)
Top Overlay:
  circle w0.25: c-2.5,0 r0.125
  lines w0.2: -0.45,-0.8 -0.45,0.8 ; -0.25,-0.8 -0.25,0.8 ; 0.65,-0.8 -0.65,-0.8 -0.65,0.8 0.65,0.8
Mechanical 14:
  lines w0.1: -1.5,-0.8 -1.5,0.8 ; -1.4,-0.8 -1.4,0.8 ; -1.3,-0.8 -1.3,0.8 ; -1.2,-0.8 -1.2,0.8 ; -1.1,-0.8 -1.1,0.8 ; -1,-0.8 -1,0.8 ; -0.9,-0.8 -0.9,0.8 ; -1.6,-0.8 -1.6,0.8 1.6,0.8 1.6,-0.8 -1.6,-0.8
Mechanical 15:
  lines w0.05: -0.5,0 0.5,0 ; 0,-0.5 0,0.5 ; -2.25,-1.15 -2.25,1.15 2.25,1.15 2.25,-1.15 -2.25,-1.15
3D body "LED_AVAGO_HSMC-C150.stp": height 1.2, standoff 0, extent -1.65,-0.85 1.65,0.85

## LED_AVAGO_HSME-C110 [mm] "Green Chip LED, 2-Leads, Body 3.3x1.6mm, Side Emitting Package"
height 1.1
pads (3):
  rect 1.5x1 smd: 1(-1.75,0) 2(1.75,0)
  rect 0.9x0.9 smd: 3(0,0.65)
Top Overlay:
  circle w0.25: c-1.75,1.15 r0.125
  lines w0.2: -0.857,-0.814 ccw(c0,-0.3) 0.857,-0.814
Mechanical 8:
  lines w0.05: -2.25,0 -1.75,0 -1.75,-0.5 ; -0.5,0 0,0 0,-0.5 ; -0.5,0.65 0,0.65 0,0.15 ; 1.25,0 1.75,0 1.75,-0.5
  text "K" at -1.483,-0.25 h0.5
Mechanical 14:
  lines w0.1: -1,-0.3 ccw(c0,-0.3) 1,-0.3 ; -1.65,-0.3 1.65,-0.3 1.65,0.3 -1.65,0.3 -1.65,-0.3
Mechanical 15:
  lines w0.05: -2.75,-1.55 2.75,-1.55 2.75,1.35 -2.75,1.35 -2.75,-1.55
3D body "LED_AVAGO_HSME-C110.stp": height 1, standoff 0, extent -1.65,-1.3 1.65,0.3

## LED_AVAGO_HSME-C120 [mm] "Green Chip LED, 2-Leads, Body 1.7x1.1mm, Side Emitting Package"
height 0.7
pads (3):
  rect 0.8x0.7 smd: 1(-1,0) 2(1,0)
  rect 0.4x0.4 smd: 3(0,0.35)
Top Overlay:
  circle w0.25: c-1,0.8 r0.125
  lines w0.2: -0.514,-0.609 ccw(c0,-0.3) -0.332,-0.8 0.332,-0.8 ccw(c0,-0.3) 0.514,-0.609
Mechanical 8:
  lines w0.05: -1,0 1,0 ; 0,0 0,0.35 ; -1.4,-0.35 -1.4,0.35 -0.6,0.35 -0.6,-0.35 -1.4,-0.35 ; -0.2,0.15 -0.2,0.55 0.2,0.55 0.2,0.15 -0.2,0.15 ; 0.6,-0.35 0.6,0.35 1.4,0.35 1.4,-0.35 0.6,-0.35
Mechanical 14:
  lines w0.1: -0.6,-0.3 ccw(c0,-0.3) -0.332,-0.8 0.332,-0.8 ccw(c0,-0.3) 0.6,-0.3 ; -0.85,-0.3 0.85,-0.3 0.85,0.3 -0.85,0.3 -0.85,-0.3
Mechanical 15:
  lines w0.05: -0.3,0 0.3,0 ; 0,-0.3 0,0.3 ; -1.65,-1.05 -1.65,0.8 1.65,0.8 1.65,-1.05 -1.65,-1.05
3D body "LED_AVAGO_HSME-C120.stp": height 0.7, standoff 0, extent -0.85,-0.8 0.85,0.3